# Altium integrated library LEMO Unipole And Multipole Type Connectors.IntLib: 1566 symbols (part 3 of 13)
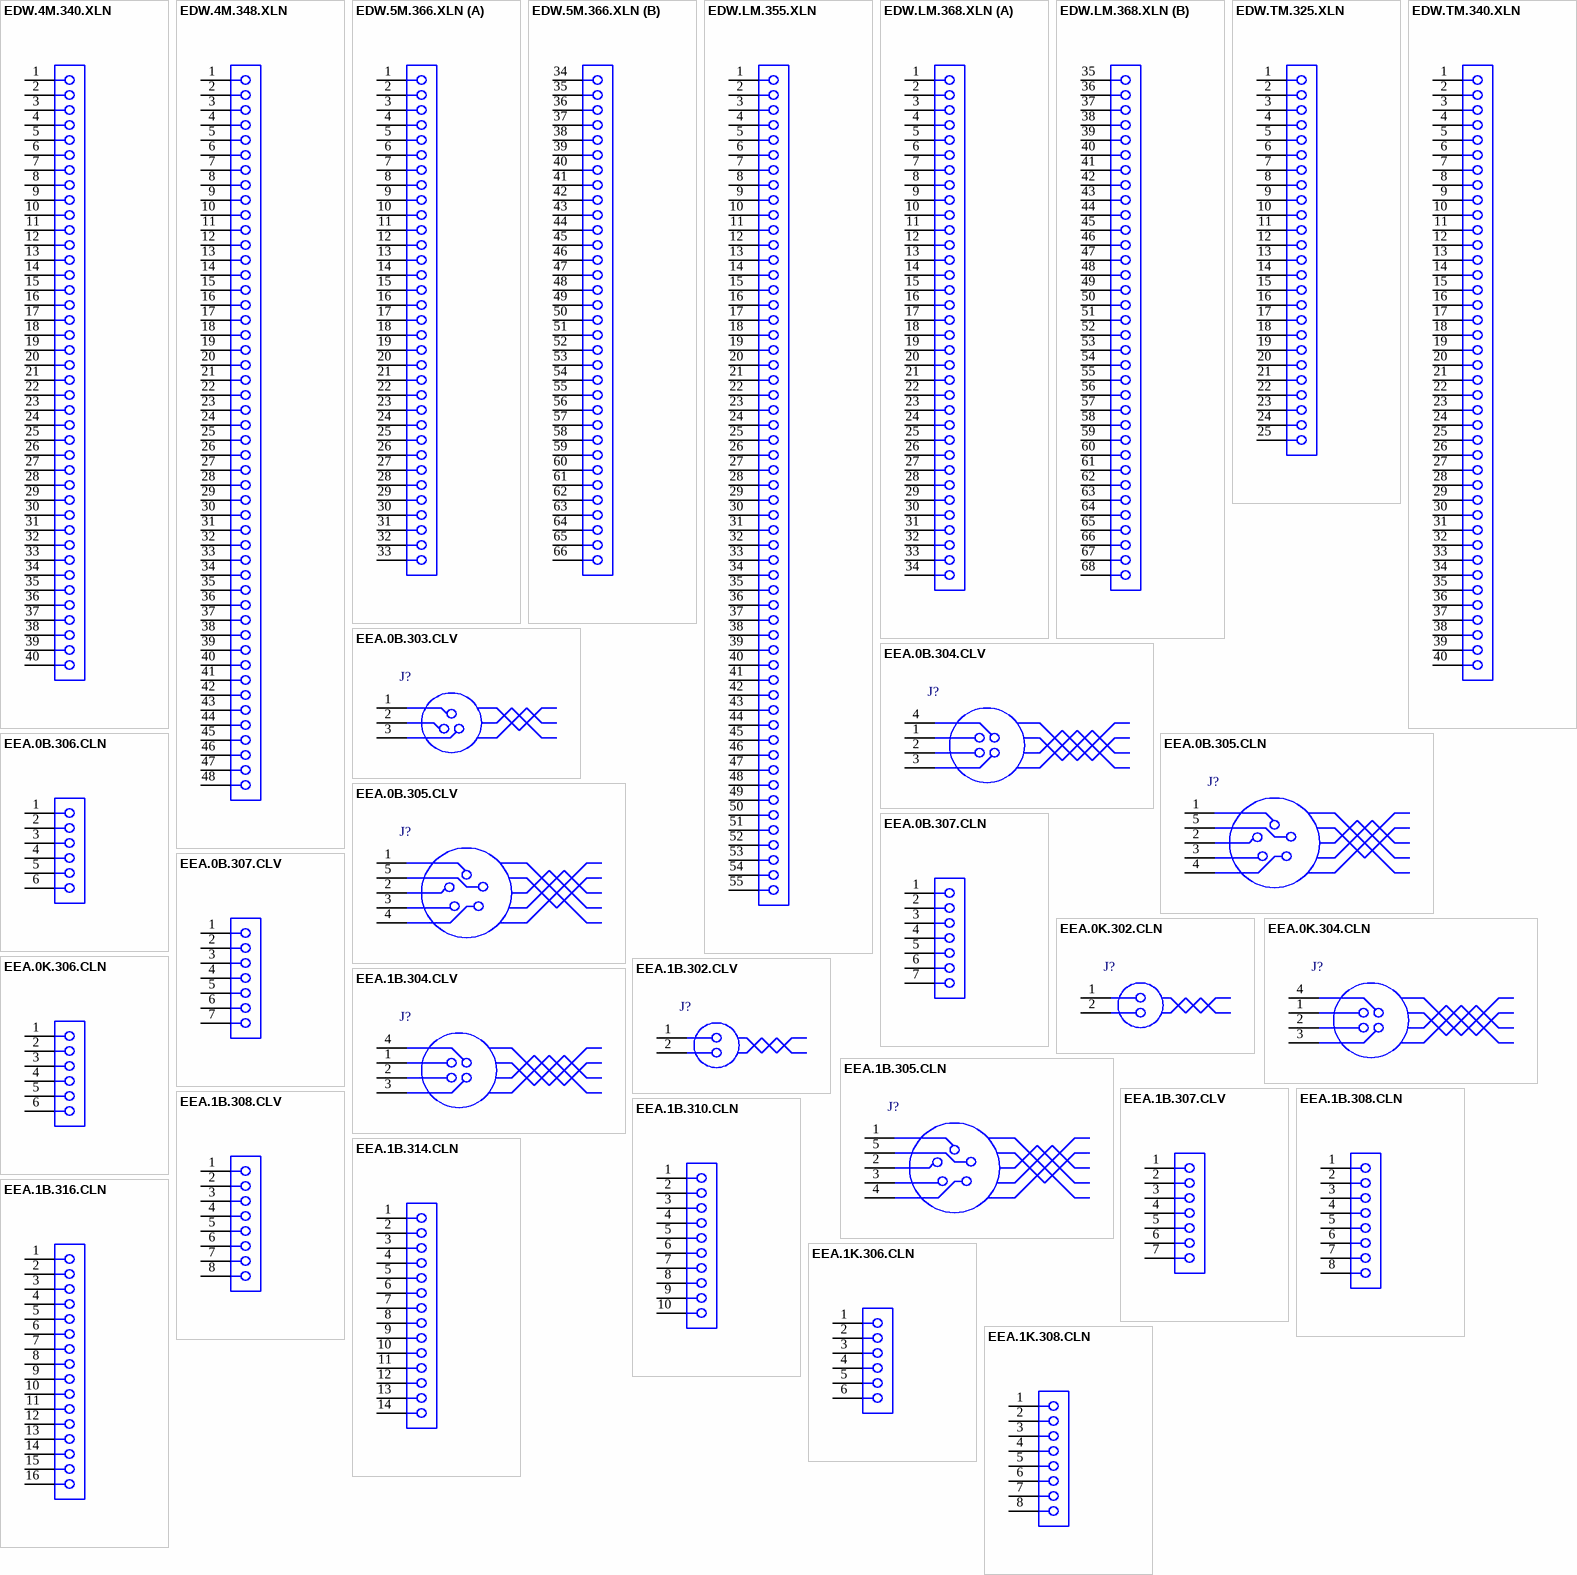
[diagram p45: symbols EDW.4M.340.XLN to EEA.1K.308.CLN]

## EEA.0B.307.CLN
designator J?
Fixed receptacle, nut fixing with straight contacts for printed circuit(back panel mounting), Key (A), 0B series, Multipole Type with 7 Contacts; Manufacturer: LEMO; PartNumber: EEA.0B.307.CLN; Number of contacts: 7; Contact Diameter: 0.5 mm; AWG: 28; Rated Current(A): 2.5; DatasheetVersion: Jun-14; PackageReference: EEA.0B.307.CLN; PackageDescription: Fixed receptacle, nut fixing with straight contacts for printed circuit(back panel mounting), Key(A) for Printed Circuit; ComponentLink1Description: Manufacturer URL; ComponentLink1URL: http://www.lemo.com; ComponentLink2Description: Datasheet; ComponentLink2URL: http://intra.lemo.ch/catalog/ROW/UK_English/unipole_multipole.pdf
footprint EEA.0B.307.CLN (Socket, Female, Body 9mm dia. Height 16.3 mm, Through hole)
pins: 1, 2, 3, 4, 5, 6, 7

## EEA.0B.307.CLV
designator J?
Fixed receptacle, nut fixing with elbow contacts for printed circuit(back panel mounting), Key (A), 0B series, Multipole Type with 7 Contacts; Manufacturer: LEMO; PartNumber: EEA.0B.307.CLV; Number of contacts: 7; Contact Diameter: 0.5 mm; AWG: 28; Rated Current(A): 0; DatasheetVersion: Jun-14; PackageReference: EEA.0B.307.CLV; PackageDescription: Fixed receptacle, nut fixing with elbow contacts for printed circuit(back panel mounting), Key(A) for Printed Circuit; ComponentLink1Description: Manufacturer URL; ComponentLink1URL: http://www.lemo.com; ComponentLink2Description: Datasheet; ComponentLink2URL: http://intra.lemo.ch/catalog/ROW/UK_English/unipole_multipole.pdf
footprint EEA.0B.307.CLV (Socket, Female, Body 9mm dia. Height 19.1 mm, Through hole)
pins: 1, 2, 3, 4, 5, 6, 7

## EEA.0K.302.CLN
designator J?
Fixed receptacle, nut fixing, with straight contacts for printed circuit (back panel mounting), Key (A), 0K series, Multipole Type with 2 Contacts; Manufacturer: LEMO; PartNumber: EEA.0K.302.CLN; Number of contacts: 2; Contact Diameter: 0.9 mm; AWG: 22; Rated Current(A): 10; DatasheetVersion: Jun-14; PackageReference: EEA.0K.302.CLN; PackageDescription: Fixed receptacle, nut fixing, with straight contacts for printed circuit (back panel mounting), Key(A) for Printed Circuit; ComponentLink1Description: Manufacturer URL; ComponentLink1URL: http://www.lemo.com; ComponentLink2Description: Datasheet; ComponentLink2URL: http://intra.lemo.ch/catalog/ROW/UK_English/unipole_multipole.pdf
footprint EEA.0K.302.CLN (Socket, Female, Body 14mm dia. Height 17.6 mm, Through hole)
pins: 1, 2

## EEA.0K.304.CLN
designator J?
Fixed receptacle, nut fixing, with straight contacts for printed circuit (back panel mounting), Key (A), 0K series, Multipole Type with 4 Contacts; Manufacturer: LEMO; PartNumber: EEA.0K.304.CLN; Number of contacts: 4; Contact Diameter: 0.7 mm; AWG: 24; Rated Current(A): 7; DatasheetVersion: Jun-14; PackageReference: EEA.0K.304.CLN; PackageDescription: Fixed receptacle, nut fixing, with straight contacts for printed circuit (back panel mounting), Key(A) for Printed Circuit; ComponentLink1Description: Manufacturer URL; ComponentLink1URL: http://www.lemo.com; ComponentLink2Description: Datasheet; ComponentLink2URL: http://intra.lemo.ch/catalog/ROW/UK_English/unipole_multipole.pdf
footprint EEA.0K.304.CLN (Socket, Female, Body 14mm dia. Height 17.6 mm, Through hole)
pins: 1, 2, 3, 4

## EEA.0K.306.CLN
designator J?
Fixed receptacle, nut fixing, with straight contacts for printed circuit (back panel mounting), Key (A), 0K series, Multipole Type with 6 Contacts; Manufacturer: LEMO; PartNumber: EEA.0K.306.CLN; Number of contacts: 6; Contact Diameter: 0.5 mm; AWG: 28; Rated Current(A): 2.5; DatasheetVersion: Jun-14; PackageReference: EEA.0K.306.CLN; PackageDescription: Fixed receptacle, nut fixing, with straight contacts for printed circuit (back panel mounting), Key(A) for Printed Circuit; Supplier 1: Mouser; Supplier Part Number 1: 736-EEA0K306CLN; Supplier 2: Digi-Key; Supplier Part Number 2: EEA.0K.306.CLN-ND; ComponentLink1Description: Manufacturer URL; ComponentLink1URL: http://www.lemo.com; ComponentLink2Description: Datasheet; ComponentLink2URL: http://intra.lemo.ch/catalog/ROW/UK_English/unipole_multipole.pdf
footprint EEA.0K.306.CLN (Socket, Female, Body 14mm dia. Height 17.6 mm, Through hole)
pins: 1, 2, 3, 4, 5, 6

## EEA.1B.302.CLV
designator J?
Fixed receptacle, nut fixing with elbow contacts for printed circuit(back panel mounting), Key (A), 1B series, Multipole Type with 2 Contacts; Manufacturer: LEMO; PartNumber: EEA.1B.302.CLV; Number of contacts: 2; Contact Diameter: 1.3 mm; AWG: 20; Rated Current(A): 12; DatasheetVersion: Jun-14; PackageReference: EEA.1B.302.CLV; PackageDescription: Fixed receptacle, nut fixing with elbow contacts for printed circuit(back panel mounting), Key(A) for Printed Circuit; ComponentLink1Description: Manufacturer URL; ComponentLink1URL: http://www.lemo.com; ComponentLink2Description: Datasheet; ComponentLink2URL: http://intra.lemo.ch/catalog/ROW/UK_English/unipole_multipole.pdf
footprint EEA.1B.302.CLV (Socket, Female, Body 12mm dia. Height 21.1 mm, Through hole)
pins: 1, 2

## EEA.1B.304.CLV
designator J?
Fixed receptacle, nut fixing with elbow contacts for printed circuit(back panel mounting), Key (A), 1B series, Multipole Type with 4 Contacts; Manufacturer: LEMO; PartNumber: EEA.1B.304.CLV; Number of contacts: 4; Contact Diameter: 0.9 mm; AWG: 22; Rated Current(A): 6; DatasheetVersion: Jun-14; PackageReference: EEA.1B.304.CLV; PackageDescription: Fixed receptacle, nut fixing with elbow contacts for printed circuit(back panel mounting), Key(A) for Printed Circuit; ComponentLink1Description: Manufacturer URL; ComponentLink1URL: http://www.lemo.com; ComponentLink2Description: Datasheet; ComponentLink2URL: http://intra.lemo.ch/catalog/ROW/UK_English/unipole_multipole.pdf
footprint EEA.1B.304.CLV (Socket, Female, Body 12mm dia. Height 21.1 mm, Through hole)
pins: 1, 2, 3, 4

## EEA.1B.305.CLN
designator J?
Fixed receptacle, nut fixing with straight contacts for printed circuit(back panel mounting), Key (A), 1B series, Multipole Type with 5 Contacts; Manufacturer: LEMO; PartNumber: EEA.1B.305.CLN; Number of contacts: 5; Contact Diameter: 0.9 mm; AWG: 22; Rated Current(A): 9; DatasheetVersion: Jun-14; PackageReference: EEA.1B.305.CLN; PackageDescription: Fixed receptacle, nut fixing with straight contacts for printed circuit(back panel mounting), Key(A) for Printed Circuit; Supplier 1: Mouser; Supplier Part Number 1: 736-EEA1B305CLN; Supplier 2: Digi-Key; Supplier Part Number 2: EEA.1B.305.CLN-ND; ComponentLink1Description: Manufacturer URL; ComponentLink1URL: http://www.lemo.com; ComponentLink2Description: Datasheet; ComponentLink2URL: http://intra.lemo.ch/catalog/ROW/UK_English/unipole_multipole.pdf
footprint EEA.1B.305.CLN (Socket, Female, Body 12mm dia. Height 21.1 mm, Through hole)
pins: 1, 2, 3, 4, 5

## EEA.1B.307.CLV
designator J?
Fixed receptacle, nut fixing with elbow contacts for printed circuit(back panel mounting), Key (A), 1B series, Multipole Type with 7 Contacts; Manufacturer: LEMO; PartNumber: EEA.1B.307.CLV; Number of contacts: 7; Contact Diameter: 0.7 mm; AWG: 24; Rated Current(A): 6; DatasheetVersion: Jun-14; PackageReference: EEA.1B.307.CLV; PackageDescription: Fixed receptacle, nut fixing with elbow contacts for printed circuit(back panel mounting), Key(A) for Printed Circuit; Supplier 1: Mouser; Supplier Part Number 1: 736-EEA1B307CLV; Supplier 2: Digi-Key; Supplier Part Number 2: EEA.1B.307.CLV-ND; ComponentLink1Description: Manufacturer URL; ComponentLink1URL: http://www.lemo.com; ComponentLink2Description: Datasheet; ComponentLink2URL: http://intra.lemo.ch/catalog/ROW/UK_English/unipole_multipole.pdf
footprint EEA.1B.307.CLV (Socket, Female, Body 12mm dia. Height 21.1 mm, Through hole)
pins: 1, 2, 3, 4, 5, 6, 7

## EEA.1B.308.CLN
designator J?
Fixed receptacle, nut fixing with straight contacts for printed circuit(back panel mounting), Key (A), 1B series, Multipole Type with 8 Contacts; Manufacturer: LEMO; PartNumber: EEA.1B.308.CLN; Number of contacts: 8; Contact Diameter: 0.7 mm; AWG: 24; Rated Current(A): 5; DatasheetVersion: Jun-14; PackageReference: EEA.1B.308.CLN; PackageDescription: Fixed receptacle, nut fixing with straight contacts for printed circuit(back panel mounting), Key(A) for Printed Circuit; Supplier 1: Mouser; Supplier Part Number 1: 736-EEA1B308CLN; Supplier 2: Digi-Key; Supplier Part Number 2: EEA.1B.308.CLN-ND; ComponentLink1Description: Manufacturer URL; ComponentLink1URL: http://www.lemo.com; ComponentLink2Description: Datasheet; ComponentLink2URL: http://intra.lemo.ch/catalog/ROW/UK_English/unipole_multipole.pdf
footprint EEA.1B.308.CLN (Socket, Female, Body 12mm dia. Height 21.1 mm, Through hole)
pins: 1, 2, 3, 4, 5, 6, 7, 8

## EEA.1B.308.CLV
designator J?
Fixed receptacle, nut fixing with elbow contacts for printed circuit(back panel mounting), Key (A), 1B series, Multipole Type with 8 Contacts; Manufacturer: LEMO; PartNumber: EEA.1B.308.CLV; Number of contacts: 8; Contact Diameter: 0.7 mm; AWG: 24; Rated Current(A): 0; DatasheetVersion: Jun-14; PackageReference: EEA.1B.308.CLV; PackageDescription: Fixed receptacle, nut fixing with elbow contacts for printed circuit(back panel mounting), Key(A) for Printed Circuit; ComponentLink1Description: Manufacturer URL; ComponentLink1URL: http://www.lemo.com; ComponentLink2Description: Datasheet; ComponentLink2URL: http://intra.lemo.ch/catalog/ROW/UK_English/unipole_multipole.pdf
footprint EEA.1B.308.CLV (Socket, Female, Body 12mm dia. Height 21.1 mm, Through hole)
pins: 1, 2, 3, 4, 5, 6, 7, 8

## EEA.1B.310.CLN
designator J?
Fixed receptacle, nut fixing with straight contacts for printed circuit(back panel mounting), Key (A), 1B series, Multipole Type with 10 Contacts; Manufacturer: LEMO; PartNumber: EEA.1B.310.CLN; Number of contacts: 10; Contact Diameter: 0.5 mm; AWG: 28; Rated Current(A): 2.5; DatasheetVersion: Jun-14; PackageReference: EEA.1B.310.CLN; PackageDescription: Fixed receptacle, nut fixing with straight contacts for printed circuit(back panel mounting), Key(A) for Printed Circuit; Supplier 1: Mouser; Supplier Part Number 1: 736-EEA1B310CLN; Supplier 2: Digi-Key; Supplier Part Number 2: EEA.1B.310.CLN-ND; ComponentLink1Description: Manufacturer URL; ComponentLink1URL: http://www.lemo.com; ComponentLink2Description: Datasheet; ComponentLink2URL: http://intra.lemo.ch/catalog/ROW/UK_English/unipole_multipole.pdf
footprint EEA.1B.310.CLN (Socket, Female, Body 12mm dia. Height 21.1 mm, Through hole)
pins: 1, 2, 3, 4, 5, 6, 7, 8, 9, 10

## EEA.1B.314.CLN
designator J?
Fixed receptacle, nut fixing with straight contacts for printed circuit(back panel mounting), Key (A), 1B series, Multipole Type with 14 Contacts; Manufacturer: LEMO; PartNumber: EEA.1B.314.CLN; Number of contacts: 14; Contact Diameter: 0.5 mm; AWG: 28; Rated Current(A): 2; DatasheetVersion: Jun-14; PackageReference: EEA.1B.314.CLN; PackageDescription: Fixed receptacle, nut fixing with straight contacts for printed circuit(back panel mounting), Key(A) for Printed Circuit; Supplier 1: Mouser; Supplier Part Number 1: 736-EEA1B314CLN; Supplier 2: Digi-Key; Supplier Part Number 2: EEA.1B.314.CLN-ND; ComponentLink1Description: Manufacturer URL; ComponentLink1URL: http://www.lemo.com; ComponentLink2Description: Datasheet; ComponentLink2URL: http://intra.lemo.ch/catalog/ROW/UK_English/unipole_multipole.pdf
footprint EEA.1B.314.CLN (Socket, Female, Body 12mm dia. Height 21.1 mm, Through hole)
pins: 1, 2, 3, 4, 5, 6, 7, 8, 9, 10, 11, 12, 13, 14

## EEA.1B.316.CLN
designator J?
Fixed receptacle, nut fixing with straight contacts for printed circuit(back panel mounting), Key (A), 1B series, Multipole Type with 16 Contacts; Manufacturer: LEMO; PartNumber: EEA.1B.316.CLN; Number of contacts: 16; Contact Diameter: 0.5 mm; AWG: 28; Rated Current(A): 1.5; DatasheetVersion: Jun-14; PackageReference: EEA.1B.316.CLN; PackageDescription: Fixed receptacle, nut fixing with straight contacts for printed circuit(back panel mounting), Key(A) for Printed Circuit; ComponentLink1Description: Manufacturer URL; ComponentLink1URL: http://www.lemo.com; ComponentLink2Description: Datasheet; ComponentLink2URL: http://intra.lemo.ch/catalog/ROW/UK_English/unipole_multipole.pdf
footprint EEA.1B.316.CLN (Socket, Female, Body 12mm dia. Height 21.1 mm, Through hole)
pins: 1, 2, 3, 4, 5, 6, 7, 8, 9, 10, 11, 12, 13, 14, 15, 16

## EEA.1K.306.CLN
designator J?
Fixed receptacle, nut fixing, with straight contacts for printed circuit (back panel mounting), Key (A), 1K series, Multipole Type with 6 Contacts; Manufacturer: LEMO; PartNumber: EEA.1K.306.CLN; Number of contacts: 6; Contact Diameter: 0.7 mm; AWG: 24; Rated Current(A): 7; DatasheetVersion: Jun-14; PackageReference: EEA.1K.306.CLN; PackageDescription: Fixed receptacle, nut fixing, with straight contacts for printed circuit (back panel mounting), Key(A) for Printed Circuit; ComponentLink1Description: Manufacturer URL; ComponentLink1URL: http://www.lemo.com; ComponentLink2Description: Datasheet; ComponentLink2URL: http://intra.lemo.ch/catalog/ROW/UK_English/unipole_multipole.pdf
footprint EEA.1K.306.CLN (Socket, Female, Body 16mm dia., Through hole)
pins: 1, 2, 3, 4, 5, 6

## EEA.1K.308.CLN
designator J?
Fixed receptacle, nut fixing, with straight contacts for printed circuit (back panel mounting), Key (A), 1K series, Multipole Type with 8 Contacts; Manufacturer: LEMO; PartNumber: EEA.1K.308.CLN; Number of contacts: 8; Contact Diameter: 0.7 mm; AWG: 24; Rated Current(A): 5; DatasheetVersion: Jun-14; PackageReference: EEA.1K.308.CLN; PackageDescription: Fixed receptacle, nut fixing, with straight contacts for printed circuit (back panel mounting), Key(A) for Printed Circuit; ComponentLink1Description: Manufacturer URL; ComponentLink1URL: http://www.lemo.com; ComponentLink2Description: Datasheet; ComponentLink2URL: http://intra.lemo.ch/catalog/ROW/UK_English/unipole_multipole.pdf
footprint EEA.1K.308.CLN (Socket, Female, Body 16mm dia., Through hole)
pins: 1, 2, 3, 4, 5, 6, 7, 8

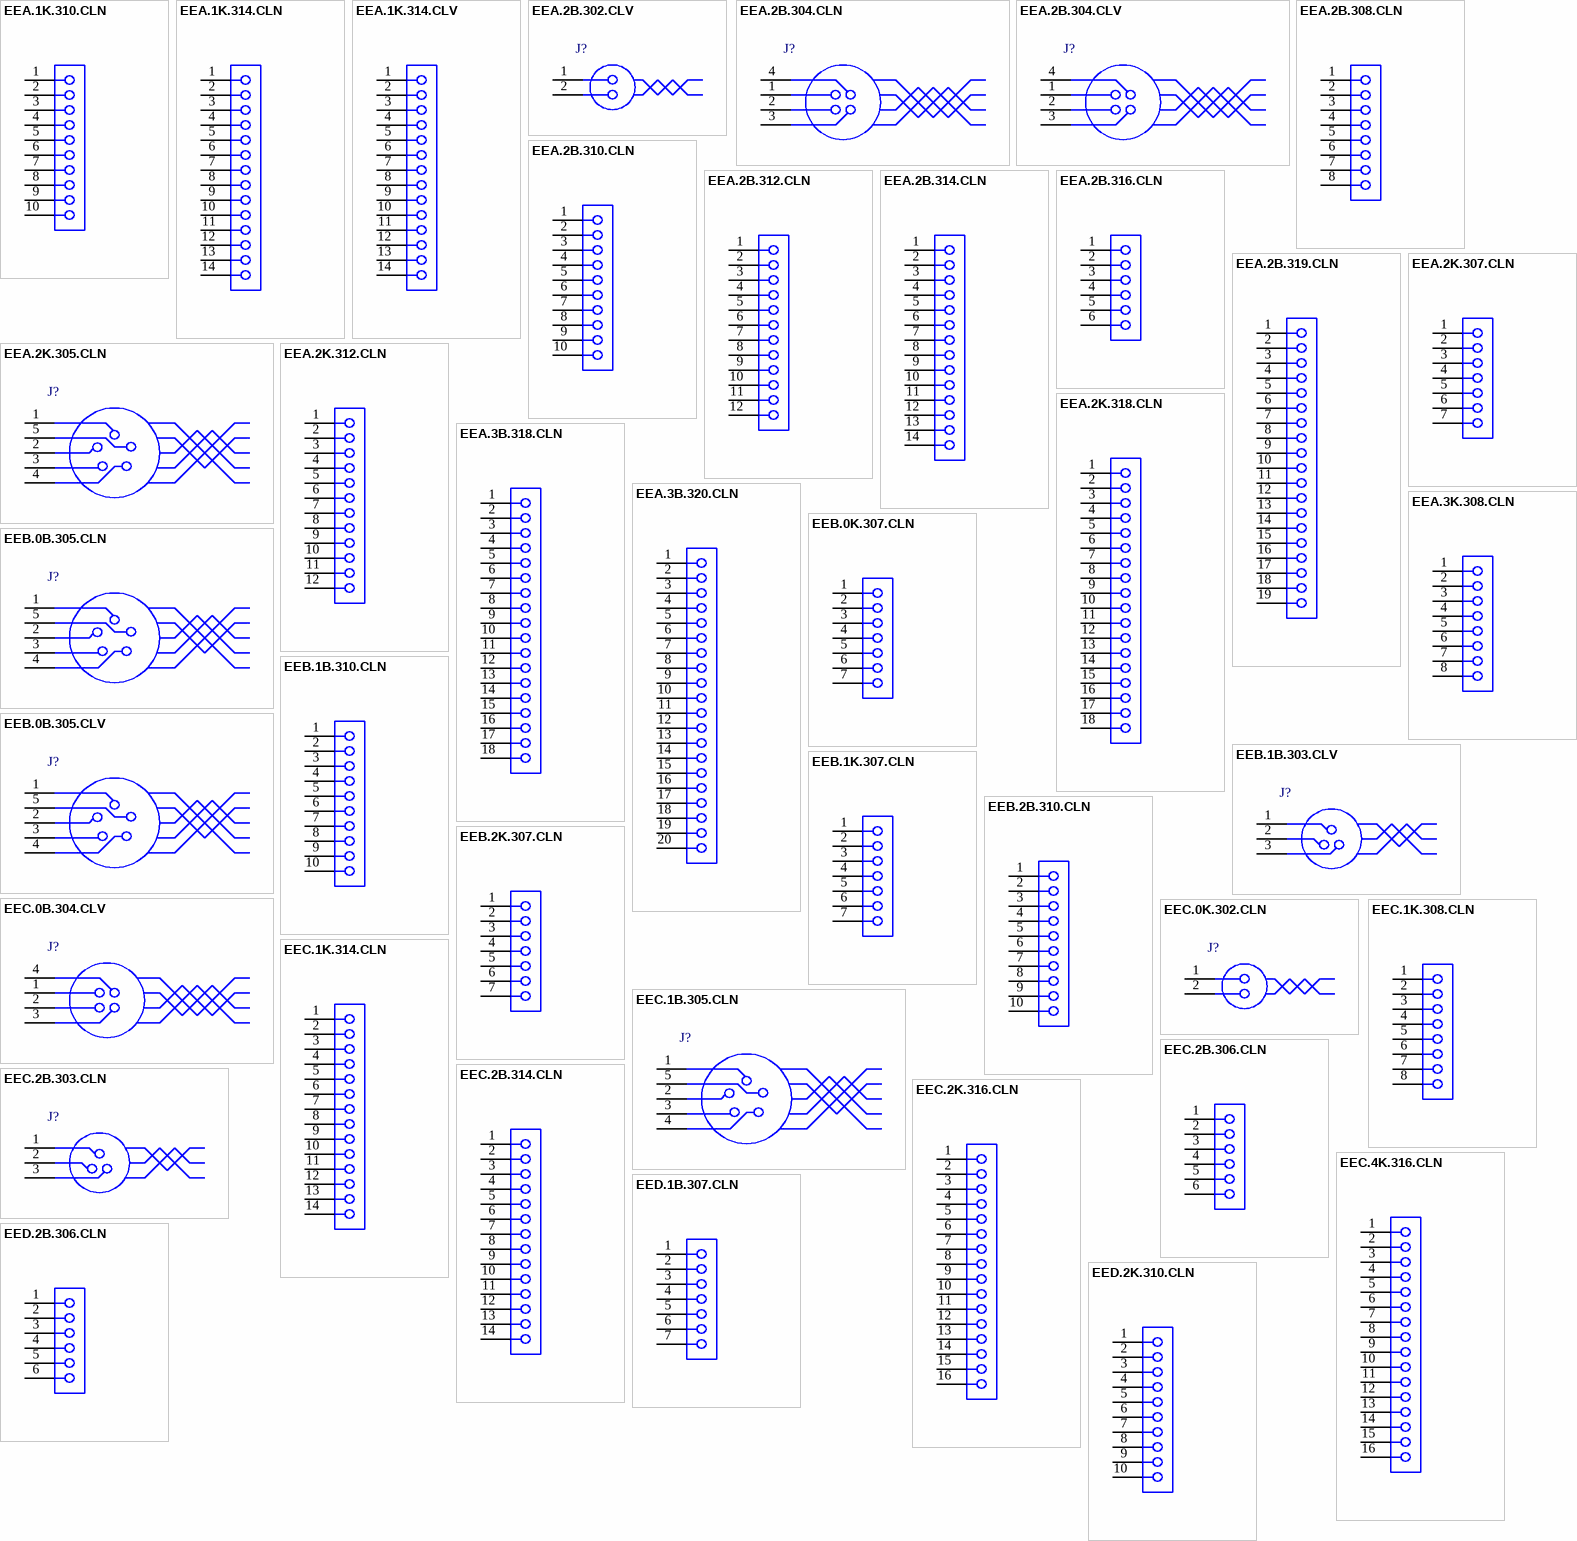
[diagram p8: symbols EEA.1K.310.CLN to EED.2K.310.CLN]

## EEA.1K.310.CLN
designator J?
Fixed receptacle, nut fixing, with straight contacts for printed circuit (back panel mounting), Key (A), 1K series, Multipole Type with 10 Contacts; Manufacturer: LEMO; PartNumber: EEA.1K.310.CLN; Number of contacts: 10; Contact Diameter: 0.5 mm; AWG: 28; Rated Current(A): 2.5; DatasheetVersion: Jun-14; PackageReference: EEA.1K.310.CLN; PackageDescription: Fixed receptacle, nut fixing, with straight contacts for printed circuit (back panel mounting), Key(A) for Printed Circuit; ComponentLink1Description: Manufacturer URL; ComponentLink1URL: http://www.lemo.com; ComponentLink2Description: Datasheet; ComponentLink2URL: http://intra.lemo.ch/catalog/ROW/UK_English/unipole_multipole.pdf
footprint EEA.1K.310.CLN (Socket, Female, Body 16mm dia., Through hole)
pins: 1, 2, 3, 4, 5, 6, 7, 8, 9, 10

## EEA.1K.314.CLN
designator J?
Fixed receptacle, nut fixing, with straight contacts for printed circuit (back panel mounting), Key (A), 1K series, Multipole Type with 14 Contacts; Manufacturer: LEMO; PartNumber: EEA.1K.314.CLN; Number of contacts: 14; Contact Diameter: 0.5 mm; AWG: 28; Rated Current(A): 2; DatasheetVersion: Jun-14; PackageReference: EEA.1K.314.CLN; PackageDescription: Fixed receptacle, nut fixing, with straight contacts for printed circuit (back panel mounting), Key(A) for Printed Circuit; Supplier 1: Mouser; Supplier Part Number 1: 736-EEA.1K.314.CLN; Supplier 2: Digi-Key; Supplier Part Number 2: EEA.1K.314.CLN-ND; ComponentLink1Description: Manufacturer URL; ComponentLink1URL: http://www.lemo.com; ComponentLink2Description: Datasheet; ComponentLink2URL: http://intra.lemo.ch/catalog/ROW/UK_English/unipole_multipole.pdf
footprint EEA.1K.314.CLN (Socket, Female, Body 16mm dia., Through hole)
pins: 1, 2, 3, 4, 5, 6, 7, 8, 9, 10, 11, 12, 13, 14

## EEA.1K.314.CLV
designator J?
Fixed receptacle, nut fixing, with elbow contacts for printed circuit (back panel mounting), Key (A), 1K series, Multipole Type with 14 Contacts; Manufacturer: LEMO; PartNumber: EEA.1K.314.CLV; Number of contacts: 14; Contact Diameter: 0.5 mm; AWG: 28; Rated Current(A): 0; DatasheetVersion: Jun-14; PackageReference: EEA.1K.314.CLV; PackageDescription: Fixed receptacle, nut fixing, with elbow contacts for printed circuit (back panel mounting), Key(A) for Printed Circuit; Supplier 1: Mouser; Supplier Part Number 1: 736-EEA1K314CLV; Supplier 2: Digi-Key; Supplier Part Number 2: EEA.1K.314.CLV-ND; ComponentLink1Description: Manufacturer URL; ComponentLink1URL: http://www.lemo.com; ComponentLink2Description: Datasheet; ComponentLink2URL: http://intra.lemo.ch/catalog/ROW/UK_English/unipole_multipole.pdf
footprint EEA.1K.314.CLV (Socket, Female, Body 16mm dia. Height 24.3 mm, Through hole)
pins: 1, 2, 3, 4, 5, 6, 7, 8, 9, 10, 11, 12, 13, 14

## EEA.2B.302.CLV
designator J?
Fixed receptacle, nut fixing with elbow contacts for printed circuit(back panel mounting), Key (A), 2B series, Multipole Type with 2 Contacts; Manufacturer: LEMO; PartNumber: EEA.2B.302.CLV; Number of contacts: 2; Contact Diameter: 2 mm; AWG: 14; Rated Current(A): 12; DatasheetVersion: Jun-14; PackageReference: EEA.2B.302.CLV; PackageDescription: Fixed receptacle, nut fixing with elbow contacts for printed circuit(back panel mounting), Key(A) for Printed Circuit; ComponentLink1Description: Manufacturer URL; ComponentLink1URL: http://www.lemo.com; ComponentLink2Description: Datasheet; ComponentLink2URL: http://intra.lemo.ch/catalog/ROW/UK_English/unipole_multipole.pdf
footprint EEA.2B.302.CLV (Socket, Female, Body 15mm dia. Height 24.6 mm, Through hole)
pins: 1, 2
